# Altium schematic symbol library Wurth_Elektronik_Passive_rev16a.SCHLIB: 1143 symbols (part 11 of 27) (continued)
## WE-PMI_0805
designator L?, comment <b>Power Multilayer Inductor / <br> / <br> / <br><b> Characteristics / <br> / <br></b></b> Compact multilayer type / <br> / <br> Suitable for applications with high currents up to 2.7 A / <br> / <br> Smallest RDC-Values starting at 40 mΩ / <br> / <br> Magnetically shielded construction: No crosstalk / <br> / <br> Operating temperature: –40 °C to +125 °C / <br> / <br> Available in four sizes and three different types (Low Profile, Low RDC & High Saturation Current) / <br> / <br> Recommended soldering profile: Reflow / <br> / <br> / <br><b> Applications / <br> / <br></b> DC/DC converters especially at high switching frequencies > 1 MHz / <br> / <br> Electronic devices with very low profile / <br> / <br> Portable devices like Smart Phones, Tablets, Notebooks and Digital Cameras / <br> / <br> / <br> / <br><a href="<br><a href="http://katalog.we-online.de/media/images/eisos/IndPMI_pf2.jpgg" title="Enlarge picture"> / <img src="http://katalog.we-online.de/media/images/eisos/IndPMI_pf2.jpg" width="320"></a><p> / Details see: <a href="http://katalog.we-online.de/en/pbs/WE-PMI?">http://katalog.we-online.de/en/pbs/WE-PMI?</a><p> / Updated  by  Dan Xu 2014-07-08<br> / 2014 (C) Wurth Elektronik
footprint WE-PMI_0805
pins: 1, 2

## WE-PMI_0806
designator L?, comment <b>Power Multilayer Inductor / <br> / <br> / <br><b> Characteristics / <br> / <br></b></b> Compact multilayer type / <br> / <br> Suitable for applications with high currents up to 2.7 A / <br> / <br> Smallest RDC-Values starting at 40 mΩ / <br> / <br> Magnetically shielded construction: No crosstalk / <br> / <br> Operating temperature: –40 °C to +125 °C / <br> / <br> Available in four sizes and three different types (Low Profile, Low RDC & High Saturation Current) / <br> / <br> Recommended soldering profile: Reflow / <br> / <br> / <br><b> Applications / <br> / <br></b> DC/DC converters especially at high switching frequencies > 1 MHz / <br> / <br> Electronic devices with very low profile / <br> / <br> Portable devices like Smart Phones, Tablets, Notebooks and Digital Cameras / <br> / <br> / <br> / <br><a href="<br><a href="http://katalog.we-online.de/media/images/eisos/IndPMI_pf2.jpgg" title="Enlarge picture"> / <img src="http://katalog.we-online.de/media/images/eisos/IndPMI_pf2.jpg" width="320"></a><p> / Details see: <a href="http://katalog.we-online.de/en/pbs/WE-PMI?">http://katalog.we-online.de/en/pbs/WE-PMI?</a><p> / Updated  by  Dan Xu 2014-07-08<br> / 2014 (C) Wurth Elektronik
footprint WE-PMI_0806
pins: 1, 2

## WE-PMI_1008
designator L?, comment <b>Power Multilayer Inductor / <br> / <br> / <br><b> Characteristics / <br> / <br></b></b> Compact multilayer type / <br> / <br> Suitable for applications with high currents up to 2.7 A / <br> / <br> Smallest RDC-Values starting at 40 mΩ / <br> / <br> Magnetically shielded construction: No crosstalk / <br> / <br> Operating temperature: –40 °C to +125 °C / <br> / <br> Available in four sizes and three different types (Low Profile, Low RDC & High Saturation Current) / <br> / <br> Recommended soldering profile: Reflow / <br> / <br> / <br><b> Applications / <br> / <br></b> DC/DC converters especially at high switching frequencies > 1 MHz / <br> / <br> Electronic devices with very low profile / <br> / <br> Portable devices like Smart Phones, Tablets, Notebooks and Digital Cameras / <br> / <br> / <br> / <br><a href="<br><a href="http://katalog.we-online.de/media/images/eisos/IndPMI_pf2.jpgg" title="Enlarge picture"> / <img src="http://katalog.we-online.de/media/images/eisos/IndPMI_pf2.jpg" width="320"></a><p> / Details see: <a href="http://katalog.we-online.de/en/pbs/WE-PMI?">http://katalog.we-online.de/en/pbs/WE-PMI?</a><p> / Updated  by  Dan Xu 2014-07-08<br> / 2014 (C) Wurth Elektronik
footprint WE-PMI_1008
pins: 1, 2

## WE-PMI_1210
designator L?, comment <b>Power Multilayer Inductor / <br> / <br> / <br><b> Characteristics / <br> / <br></b></b> Compact multilayer type / <br> / <br> Suitable for applications with high currents up to 2.7 A / <br> / <br> Smallest RDC-Values starting at 40 mΩ / <br> / <br> Magnetically shielded construction: No crosstalk / <br> / <br> Operating temperature: –40 °C to +125 °C / <br> / <br> Available in four sizes and three different types (Low Profile, Low RDC & High Saturation Current) / <br> / <br> Recommended soldering profile: Reflow / <br> / <br> / <br><b> Applications / <br> / <br></b> DC/DC converters especially at high switching frequencies > 1 MHz / <br> / <br> Electronic devices with very low profile / <br> / <br> Portable devices like Smart Phones, Tablets, Notebooks and Digital Cameras / <br> / <br> / <br> / <br><a href="<br><a href="http://katalog.we-online.de/media/images/eisos/IndPMI_pf2.jpgg" title="Enlarge picture"> / <img src="http://katalog.we-online.de/media/images/eisos/IndPMI_pf2.jpg" width="320"></a><p> / Details see: <a href="http://katalog.we-online.de/en/pbs/WE-PMI?">http://katalog.we-online.de/en/pbs/WE-PMI?</a><p> / Updated  by  Dan Xu 2014-07-08<br> / 2014 (C) Wurth Elektronik
footprint WE-PMI_1210
pins: 1, 2

## WE-POE+_EFD20
designator T?, comment <b>Power over Ethernet Plus Transformer / <br> / <br> / <br><b> Characteristics / <br> / <br></b></b> Designed to meet 25 W PoE+ requirements of IEEE802.3at / <br> / <br> Frequency range: 250–400 kHz / <br> / <br> Input voltage range: 36–72 V / <br> / <br> 1.5 kV Hipot test between primary and secondary / <br> / <br> Operating temperature: –40 °C to +125 °C / <br> / <br> / <br><b> Applications / <br> / <br></b> PoE+ powered devices / <br> / <br> IP phones / <br> / <br> WLAN-Access points / <br> / <br> Security cameras / <br> / <br> / <br> / <br><a href="<br><a href="http://katalog.we-online.de/media/images/eisos/UtPOE+_MID_pf2.jpg" title="Enlarge picture"> / <img src="http://katalog.we-online.de/media/images/eisos/UtPOE+_MID_pf2.jpg" width="320"></a><p> / Details see: <a href="http://katalog.we-online.de/en/pbs/WE-PoE_Plus?">http://katalog.we-online.de/en/pbs/WE-PoE_Plus?</a><p> / Updated  by  Dan Xu 2014-07-08<br> / 2014 (C) Wurth Elektronik
footprint WE_EFD20_SMD_12PIN
pins: 1, 2, 3, 4, 5, 6, 7, 8, 9, 10, 11, 12

## WE-POE+_EP13
designator T?, comment <b>Power over Ethernet Plus Transformer / <br> / <br> / <br><b> Characteristics / <br> / <br></b></b> Designed to meet 25 W PoE+ requirements of IEEE802.3at / <br> / <br> Frequency range: 250–400 kHz / <br> / <br> Input voltage range: 36–72 V / <br> / <br> 1.5 kV Hipot test between primary and secondary / <br> / <br> Operating temperature: –40 °C to +125 °C / <br> / <br> / <br><b> Applications / <br> / <br></b> PoE+ powered devices / <br> / <br> IP phones / <br> / <br> WLAN-Access points / <br> / <br> Security cameras / <br> / <br> / <br> / <br><a href="<br><a href="http://katalog.we-online.de/media/images/eisos/UtPOE+_MID_pf2.jpg" title="Enlarge picture"> / <img src="http://katalog.we-online.de/media/images/eisos/UtPOE+_MID_pf2.jpg" width="320"></a><p> / Details see: <a href="http://katalog.we-online.de/en/pbs/WE-PoE_Plus?">http://katalog.we-online.de/en/pbs/WE-PoE_Plus?</a><p> / Updated  by  Dan Xu 2014-07-08<br> / 2014 (C) Wurth Elektronik
footprint WE_EP13_SMD_10PIN
pins: 1 5, 2 4, 3, 4 2, 5 1, 6 10, 7 9, 8, 9 7, 10 6

## WE-POE_EFD15
designator T?, comment <b>Power over Ethernet Transformer / <br> / <br> / <br><b> Characteristics / <br> / <br></b></b> Flyback transformer designed for PoE PDs / <br> / <br> Input voltage: 36 V to 57 V / <br> / <br> Switching frequencies: 200–500 kHz / <br> / <br> Operating temperature: –40 ºC to +125 ºC / <br> / <br> Insulation test voltage: 1.5 kVAC/1 min / <br> / <br> Different output powers and voltages available / <br> / <br> / <br><b> Applications / <br> / <br></b> Suitable for PoE IC’s like LTC4267, TPS 23750, TPS 23770, LM5070, LM 5071, LM 5072 / <br> / <br> / <br><a href="<br><a href="http://katalog.we-online.de/media/images/eisos/UtPOE_MID_pf2.jpg" title="Enlarge picture"> / <img src="http://katalog.we-online.de/media/images/eisos/UtPOE_MID_pf2.jpg" width="320"></a><p> / Details see: <a href="http://katalog.we-online.de/en/pbs/WE-PoE?">http://katalog.we-online.de/en/pbs/WE-PoE?</a><p> / Updated  by  Dan Xu 2014-07-08<br> / 2014 (C) Wurth Elektronik
footprint WE_EFD15_SMD_12PIN
pins: 1, 2, 3, 4, 5, 6, 7, 8, 9, 10, 11, 12

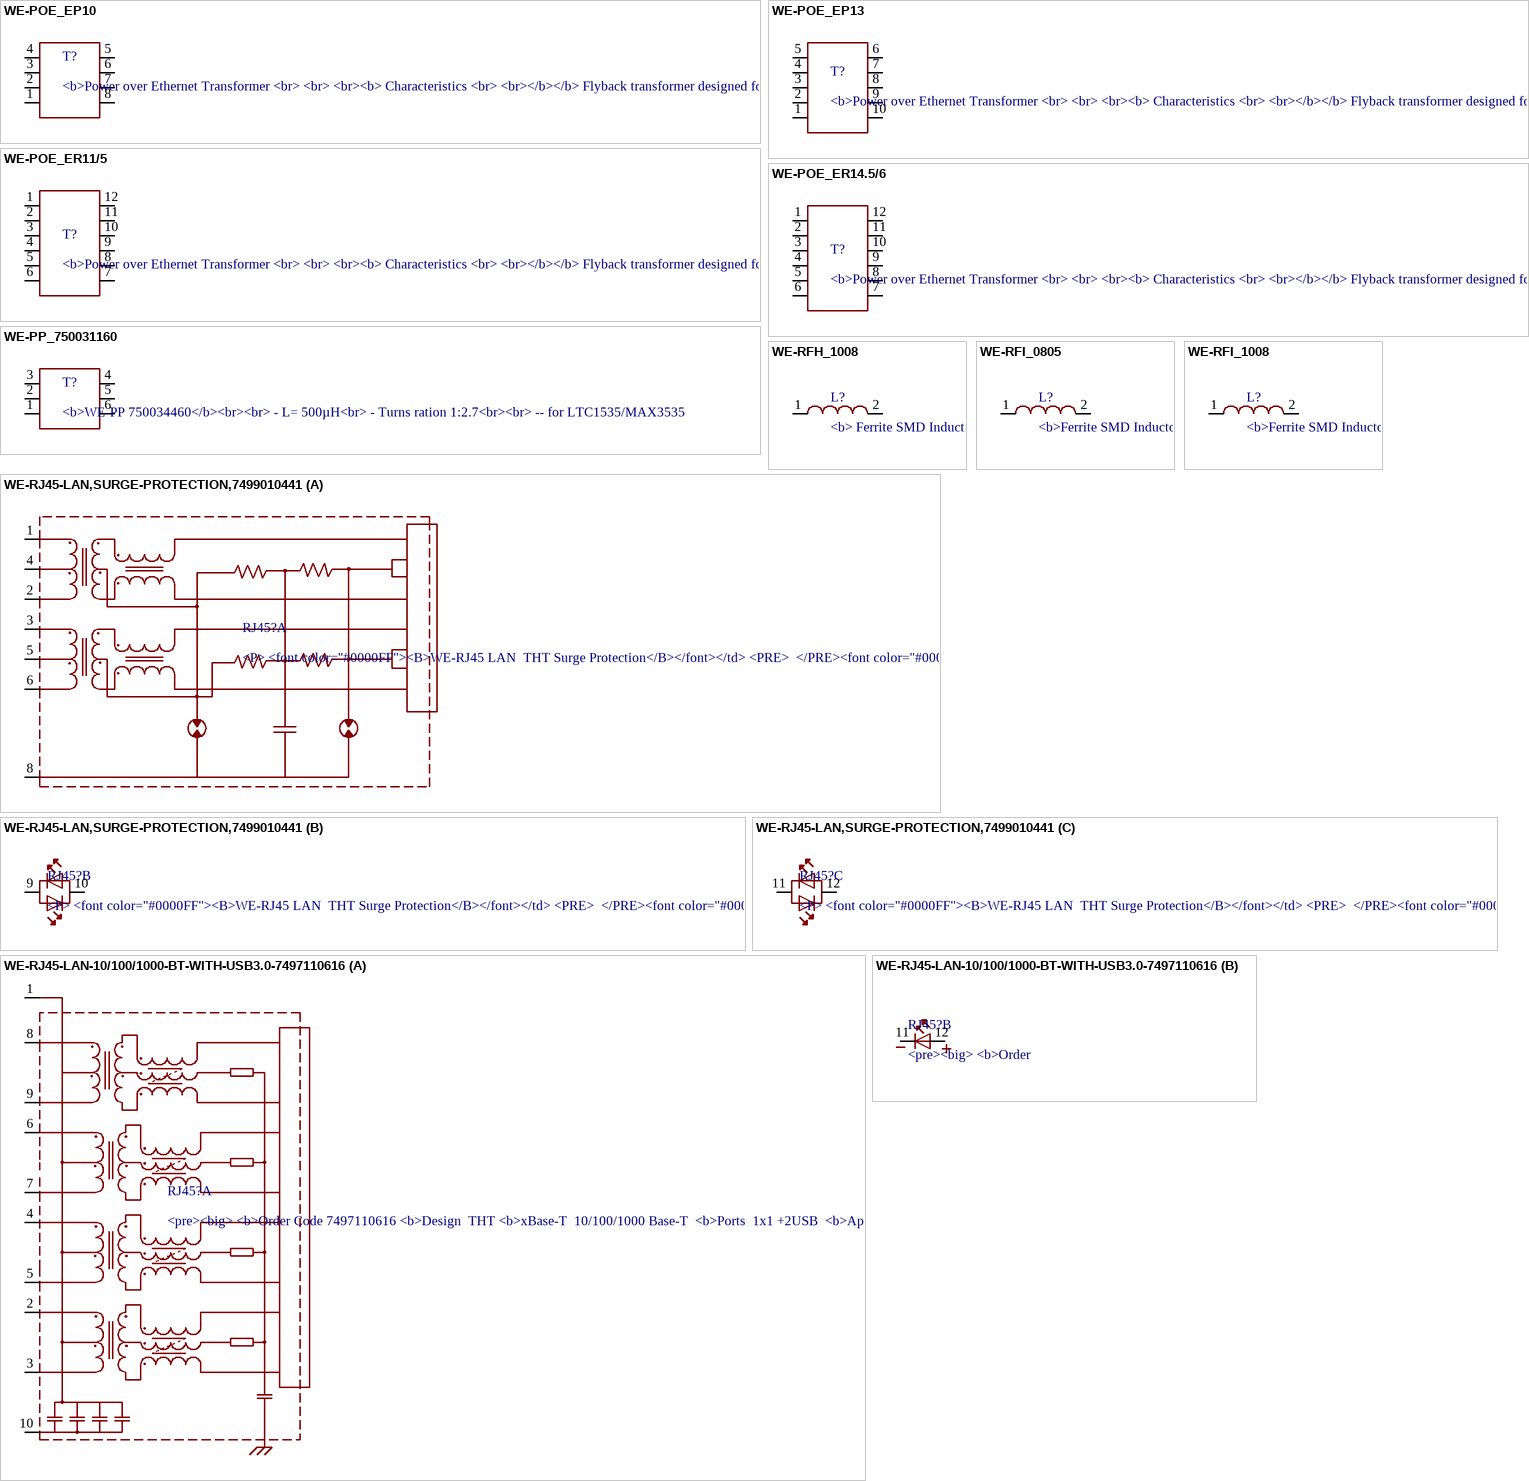
[diagram p26: symbols WE-POE_EP10 to WE-RJ45-LAN-10/100/1000-BT-WITH-USB3.0-7497110616]

## WE-POE_EP10
designator T?, comment <b>Power over Ethernet Transformer / <br> / <br> / <br><b> Characteristics / <br> / <br></b></b> Flyback transformer designed for PoE PDs / <br> / <br> Input voltage: 36 V to 57 V / <br> / <br> Switching frequencies: 200–500 kHz / <br> / <br> Operating temperature: –40 ºC to +125 ºC / <br> / <br> Insulation test voltage: 1.5 kVAC/1 min / <br> / <br> Different output powers and voltages available / <br> / <br> / <br><b> Applications / <br> / <br></b> Suitable for PoE IC’s like LTC4267, TPS 23750, TPS 23770, LM5070, LM 5071, LM 5072 / <br> / <br> / <br><a href="<br><a href="http://katalog.we-online.de/media/images/eisos/UtPOE_MID_pf2.jpg" title="Enlarge picture"> / <img src="http://katalog.we-online.de/media/images/eisos/UtPOE_MID_pf2.jpg" width="320"></a><p> / Details see: <a href="http://katalog.we-online.de/en/pbs/WE-PoE?">http://katalog.we-online.de/en/pbs/WE-PoE?</a><p> / Updated  by  Dan Xu 2014-07-08<br> / 2014 (C) Wurth Elektronik
footprint WE_EP10_SMD_8PIN
pins: 1, 2, 3, 4, 5, 6, 7, 8

## WE-POE_EP13
designator T?, comment <b>Power over Ethernet Transformer / <br> / <br> / <br><b> Characteristics / <br> / <br></b></b> Flyback transformer designed for PoE PDs / <br> / <br> Input voltage: 36 V to 57 V / <br> / <br> Switching frequencies: 200–500 kHz / <br> / <br> Operating temperature: –40 ºC to +125 ºC / <br> / <br> Insulation test voltage: 1.5 kVAC/1 min / <br> / <br> Different output powers and voltages available / <br> / <br> / <br><b> Applications / <br> / <br></b> Suitable for PoE IC’s like LTC4267, TPS 23750, TPS 23770, LM5070, LM 5071, LM 5072 / <br> / <br> / <br><a href="<br><a href="http://katalog.we-online.de/media/images/eisos/UtPOE_MID_pf2.jpg" title="Enlarge picture"> / <img src="http://katalog.we-online.de/media/images/eisos/UtPOE_MID_pf2.jpg" width="320"></a><p> / Details see: <a href="http://katalog.we-online.de/en/pbs/WE-PoE?">http://katalog.we-online.de/en/pbs/WE-PoE?</a><p> / Updated  by  Dan Xu 2014-07-08<br> / 2014 (C) Wurth Elektronik
footprint WE_EP13_SMD_10PIN
pins: 1 5, 2 4, 3, 4 2, 5 1, 6 10, 7 9, 8, 9 7, 10 6

## WE-POE_ER11/5
designator T?, comment <b>Power over Ethernet Transformer / <br> / <br> / <br><b> Characteristics / <br> / <br></b></b> Flyback transformer designed for PoE PDs / <br> / <br> Input voltage: 36 V to 57 V / <br> / <br> Switching frequencies: 200–500 kHz / <br> / <br> Operating temperature: –40 ºC to +125 ºC / <br> / <br> Insulation test voltage: 1.5 kVAC/1 min / <br> / <br> Different output powers and voltages available / <br> / <br> / <br><b> Applications / <br> / <br></b> Suitable for PoE IC’s like LTC4267, TPS 23750, TPS 23770, LM5070, LM 5071, LM 5072 / <br> / <br> / <br><a href="<br><a href="http://katalog.we-online.de/media/images/eisos/UtPOE_MID_pf2.jpg" title="Enlarge picture"> / <img src="http://katalog.we-online.de/media/images/eisos/UtPOE_MID_pf2.jpg" width="320"></a><p> / Details see: <a href="http://katalog.we-online.de/en/pbs/WE-PoE?">http://katalog.we-online.de/en/pbs/WE-PoE?</a><p> / Updated  by  Dan Xu 2014-07-08<br> / 2014 (C) Wurth Elektronik
footprint WE_ER11/5_SMD_12PIN
pins: 1, 2, 3, 4, 5, 6, 7, 8, 9, 10, 11, 12

## WE-POE_ER14.5/6
designator T?, comment <b>Power over Ethernet Transformer / <br> / <br> / <br><b> Characteristics / <br> / <br></b></b> Flyback transformer designed for PoE PDs / <br> / <br> Input voltage: 36 V to 57 V / <br> / <br> Switching frequencies: 200–500 kHz / <br> / <br> Operating temperature: –40 ºC to +125 ºC / <br> / <br> Insulation test voltage: 1.5 kVAC/1 min / <br> / <br> Different output powers and voltages available / <br> / <br> / <br><b> Applications / <br> / <br></b> Suitable for PoE IC’s like LTC4267, TPS 23750, TPS 23770, LM5070, LM 5071, LM 5072 / <br> / <br> / <br><a href="<br><a href="http://katalog.we-online.de/media/images/eisos/UtPOE_MID_pf2.jpg" title="Enlarge picture"> / <img src="http://katalog.we-online.de/media/images/eisos/UtPOE_MID_pf2.jpg" width="320"></a><p> / Details see: <a href="http://katalog.we-online.de/en/pbs/WE-PoE?">http://katalog.we-online.de/en/pbs/WE-PoE?</a><p> / Updated  by  Dan Xu 2014-07-08<br> / 2014 (C) Wurth Elektronik
footprint WE_ER14.5/6_SMD_12PIN
pins: 1, 2, 3, 4, 5, 6, 7, 8, 9, 10, 11, 12

## WE-PP_750031160
designator T?, comment <b>WE-PP 750034460</b><br><br> / - L= 500µH<br> / - Turns ration 1:2.7<br><br> / -- for LTC1535/MAX3535
footprint WE-PP_750031160
pins: 1, 2, 3, 4, 5, 6

## WE-RFH_1008
designator L?, comment <b> Ferrite SMD Inductor / <br> / <br> / <br><b> Characteristics / <br> / <br></b></b> High thermal stability / <br> / <br> Operating temperature: –40 ºC to +85 ºC / <br> / <br> High inductances / <br> / <br> High currents / <br> / <br> / <br><b> Applications / <br> / <br></b> Developed especially for RF applications / <br> / <br> Perfect for telecommunication applications / <br> / <br> / <br> / <br><a href="<br><a href="http://katalog.we-online.de/media/images/eisos/RfRFH_pf2.jpg" title="Enlarge picture"> / <img src="http://katalog.we-online.de/media/images/eisos/RfRFH_pf2.jpg" width="320"></a><p> / Details see: <a href="http://katalog.we-online.de/en/pbs/WE-RFH?">http://katalog.we-online.de/en/pbs/WE-RFH?</a><p> / Updated  by  Dan Xu 2014-07-08<br> / 2014 (C) Wurth Elektronik
footprint WE-RFH
pins: 1, 2

## WE-RFI_0805
designator L?, comment <b>Ferrite SMD Inductor / <br> / <br> / <br><b> Characteristics / <br> / <br></b></b> High thermal stability / <br> / <br> Operating temperature: –40 °C to +85 °C / <br> / <br> / <br><b> Applications / <br> / <br></b> Especially developed for RF applications / <br> / <br> RFID / <br> / <br> Low frequency radio applications (Keyless) / <br> / <br> / <br> / <br><a href="<br><a href="http://katalog.we-online.de/media/images/eisos/RfRFI_pf2.jpg" title="Enlarge picture"> / <img src="http://katalog.we-online.de/media/images/eisos/RfRFH_pf2.jpg" width="320"></a><p> / Details see: <a href="http://katalog.we-online.de/en/pbs/WE-RFI?">http://katalog.we-online.de/en/pbs/WE-RFI?</a><p> / Updated  by  Dan Xu 2014-07-08<br> / 2014 (C) Wurth Elektronik
footprint WE-RFI_0805
pins: 1, 2

## WE-RFI_1008
designator L?, comment <b>Ferrite SMD Inductor / <br> / <br> / <br><b> Characteristics / <br> / <br></b></b> High thermal stability / <br> / <br> Operating temperature: –40 °C to +85 °C / <br> / <br> / <br><b> Applications / <br> / <br></b> Especially developed for RF applications / <br> / <br> RFID / <br> / <br> Low frequency radio applications (Keyless) / <br> / <br> / <br> / <br><a href="<br><a href="http://katalog.we-online.de/media/images/eisos/RfRFI_pf2.jpg" title="Enlarge picture"> / <img src="http://katalog.we-online.de/media/images/eisos/RfRFH_pf2.jpg" width="320"></a><p> / Details see: <a href="http://katalog.we-online.de/en/pbs/WE-RFI?">http://katalog.we-online.de/en/pbs/WE-RFI?</a><p> / Updated  by  Dan Xu 2014-07-08<br> / 2014 (C) Wurth Elektronik
footprint WE-RFI_1008
pins: 1, 2

## WE-RJ45-LAN,SURGE-PROTECTION,7499010441
designator RJ45?, comment <P> <font color="#0000FF"><B>WE-RJ45 LAN / THT Surge Protection</B></font></td> / <PRE> / </PRE><font color="#0000FF"><B>Characteristics:</B></font></td> / <PRE> / With two integrated gas discharge tubes / High surge withstand voltage / Small capacitance of surge device / <PRE> / <font color="#0000FF"><B>Application:</B></font></td> / <PRE> / Telecom devices / Bridges, hubs, router, power line adapter / LAN networks in rough environments / </PRE> / <br><a href="<br><a href="http://katalog.we-online.de/media/images/eisos/UtLAN_RJ45_pf2.jpg" title="Enlarge picture"> / <img src="http://katalog.we-online.de/media/images/eisos/UtLAN_RJ45_pf2.jpg" width="320"></a><p> / Details see: <a href="http://katalog.we-online.de/en/pbs/WE-LAN_RJ45/7499010441?">http://katalog.we-online.de/en/pbs/WE-LAN_RJ45/7499010441?</a><p> / Updated  by  Dan Xu 2014-07-08<br> / 2014 (C) Würth Elektronik
footprint 7499010441
part A pins: 1 TD+, 2 TD-, 3 RD+, 4 CTD, 5 CRD, 6 RD-, 8 SHIELD
part B pins: 9 AK1, 10 AK2
part C pins: 11 AK1, 12 AK2

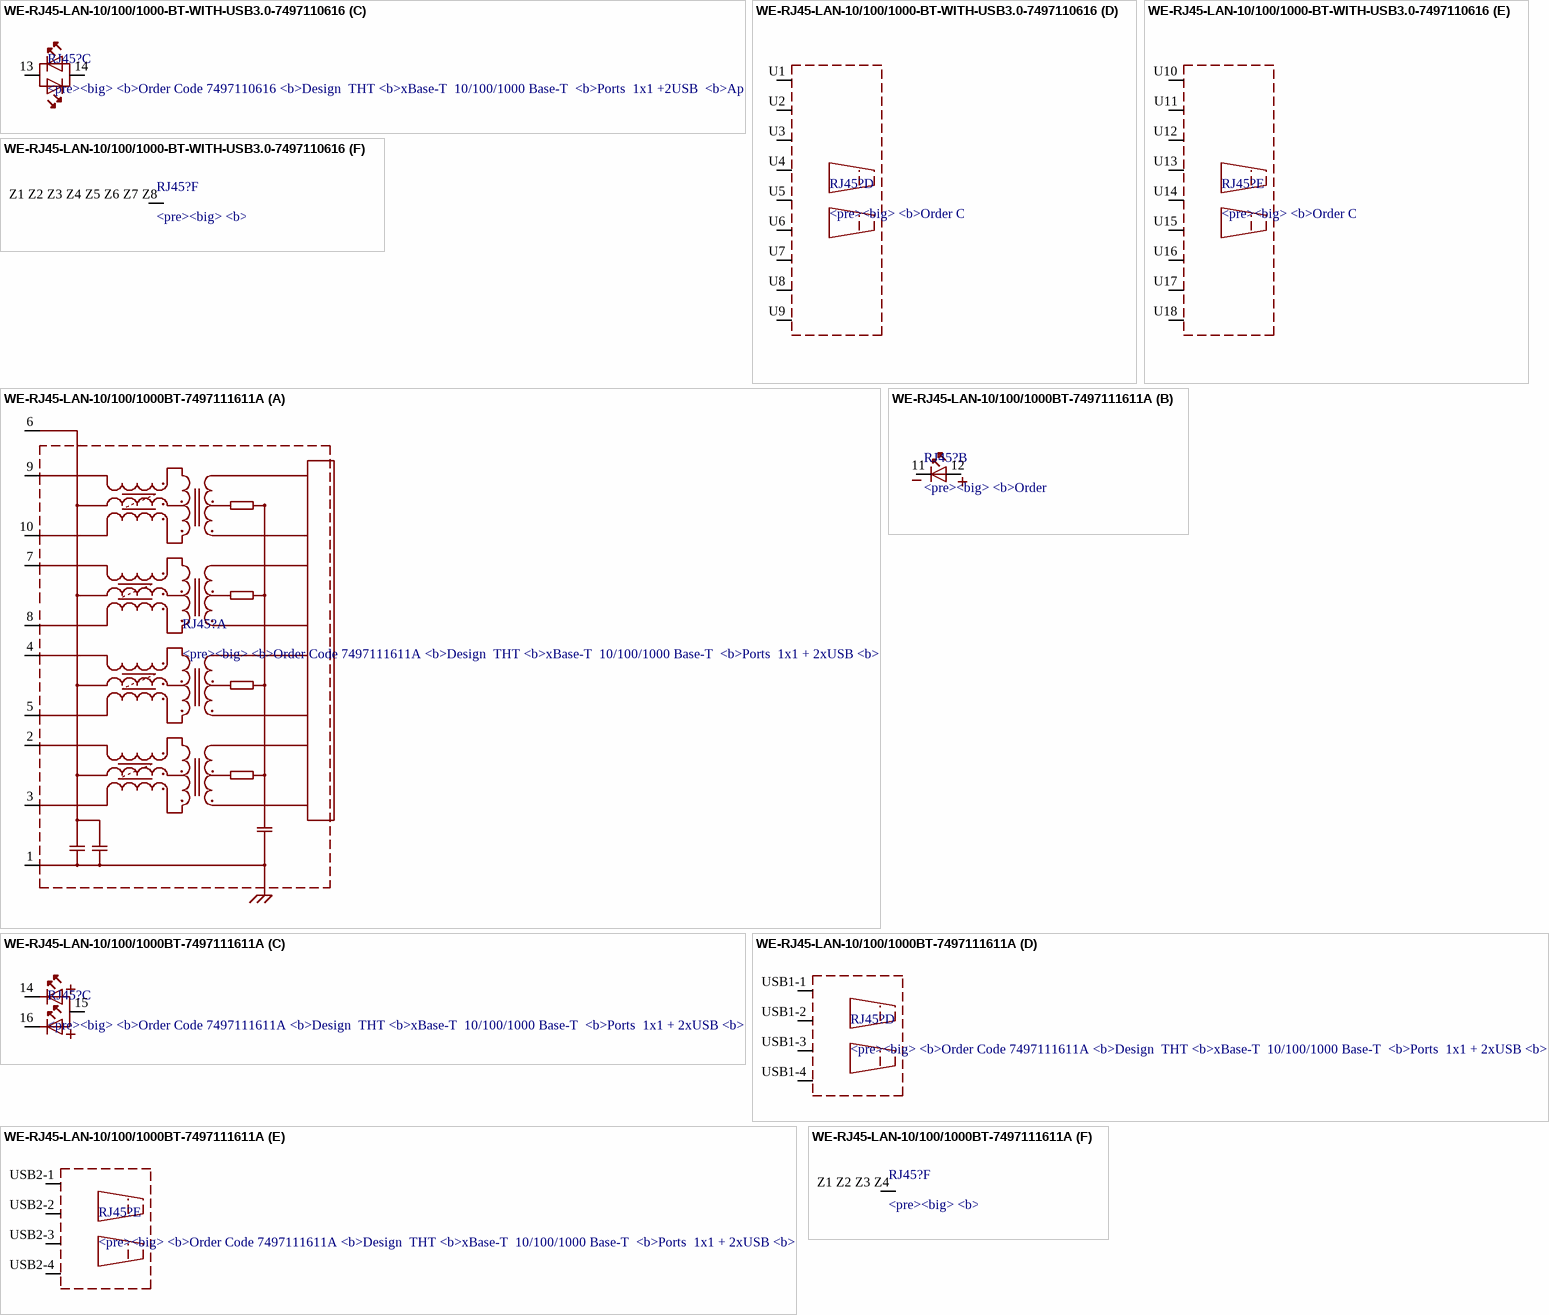
[diagram p27: symbols WE-RJ45-LAN-10/100/1000-BT-WITH-USB3.0-7497110616 to WE-RJ45-LAN-10/100/1000BT-7497111611A]

## WE-RJ45-LAN-10/100/1000-BT-WITH-USB3.0-7497110616
designator RJ45?, comment <pre><big> / <b>Order Code	7497110616 / <b>Design		THT / <b>xBase-T		10/100/1000 Base-T / <b>Ports		1x1 +2USB / <b>Application	Standard USB3.0 / <b>Tab Position	UP / <b>LED (Left-Right)	YELLOW-GREEN/OANGE / <b>EMI Fingers	NO / </b><br><a href="<br><a href="http://katalog.we-online.de/media/images/eisos/UtLAN_RJ45_pf2.jpg" title="Enlarge picture"> / <img src="http://katalog.we-online.de/media/images/eisos/UtLAN_RJ45_pf2.jpg" width="320"></a><p> / Details see: <a href="http://katalog.we-online.de/en/pbs/WE-LAN_RJ45/7497110616?">http://katalog.we-online.de/en/pbs/WE-LAN_RJ45/7497110616?</a><p> / </b> / </b>Updated  by  Dan Xu 2014-07-10<br> / </b>2014 (C) Würth Elektronik
MANUFACTURER: Würth Elektronik eiSos GmbH; CREATED-BY: Christin Zierenner; COMPANY-URL: http://www.we-online.de; CREATED-DATE: AUG 2012; DATASHEET-URL: http://katalog.we-online.de/kataloge/eisos/media/pdf/7497110616.pdf
footprint 7497110616
part A pins: 1, 2, 3, 4, 5, 6, 7, 8, 9, 10 (power)
part B pins: 11 K, 12 A
part C pins: 13 AK1, 14 AK2
part D pins: U1 VCC (power), U2 D-, U3 D+, U4 GND (power), U5 RX-, U6 RX+, U7 GND_SIG (power), U8 TX-, U9 TX+
part E pins: U10 VCC (power), U11 D-, U12 D+, U13 GND (power), U14 RX-, U15 RX+, U16 GND_SIG (power), U17 TX-, U18 TX+
part F pins: Z1 Z2 Z3 Z4 Z5 Z6 Z7 Z8 P$1 (power)

## WE-RJ45-LAN-10/100/1000BT-7497111611A
designator RJ45?, comment <pre><big> / <b>Order Code	7497111611A / <b>Design		THT / <b>xBase-T		10/100/1000 Base-T / <b>Ports		1x1 + 2xUSB / <b>Application	Standard USB2.0 / <b>Tab Position	UP / <b>LED (Left-Right)	GREEN/ORANGE-YELLOW / <b>EMI Fingers	YES</b> / </b><br><a href="<br><a href="http://katalog.we-online.de/media/images/eisos/UtLAN_RJ45_pf2.jpg" title="Enlarge picture"> / <img src="http://katalog.we-online.de/media/images/eisos/UtLAN_RJ45_pf2.jpg" width="320"></a><p> / Details see: <a href="http://katalog.we-online.de/en/pbs/WE-LAN_RJ45/7497111611A?">http://katalog.we-online.de/en/pbs/WE-LAN_RJ45/7497111611A?</a><p> / </b> / </b>Updated  by  Dan Xu 2014-07-10<br> / </b>2014 (C) Würth Elektronik
MANUFACTURER: Würth Elektronik eiSos GmbH; CREATED-BY: Christin Zierenner; COMPANY-URL: http://www.we-online.de; CREATED-DATE: AUG 2012; DATASHEET-URL: http://katalog.we-online.de/kataloge/eisos/media/pdf/7497111611A.pdf
footprint 7497111611A
part A pins: 1 (power), 2, 3, 4, 5, 6, 7, 8, 9, 10
part B pins: 11 K, 12 A
part C pins: 14 K1, 15 A1, 16 K2
part D pins: USB1-1 VCC (power), USB1-2 D-, USB1-3 D+, USB1-4 GND (power)
part E pins: USB2-1 VCC (power), USB2-2 D-, USB2-3 D+, USB2-4 GND (power)
part F pins: Z1 Z2 Z3 Z4 P$1 (power)

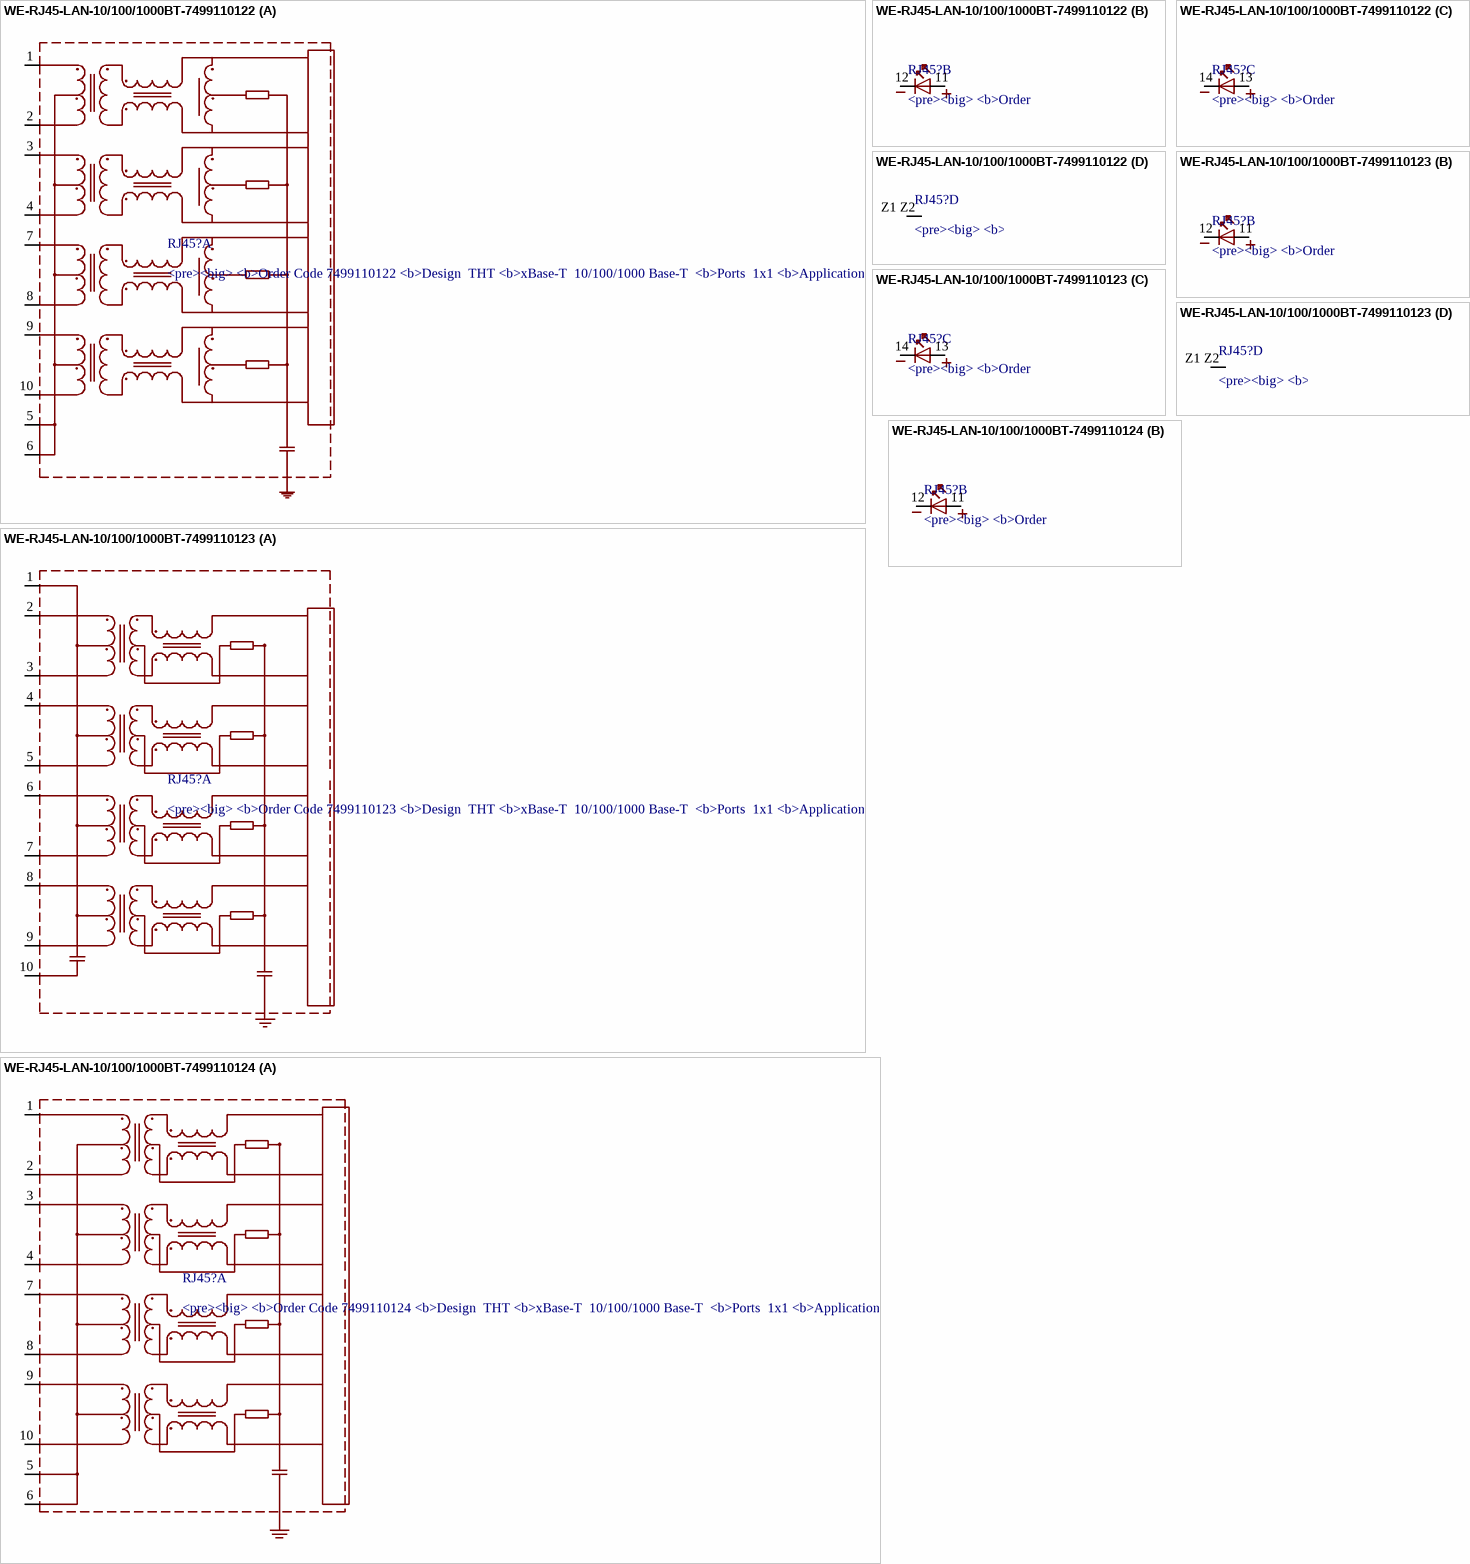
[diagram p28: symbols WE-RJ45-LAN-10/100/1000BT-7499110122 to WE-RJ45-LAN-10/100/1000BT-7499110124]